# Altium footprint library AltiumDesignerLibraries.PcbLib: 313 footprints (part 13 of 20)
Each footprint in its own frame and in the unit in brackets; x right, y up, seen from the top. Pads: shape width x height; smd on the part's side, far side on the other; paste and mask are expansions set on the pad; w line width, h text height; cw(c..) or ccw(c..) is an arc to the next point about the centre after c.
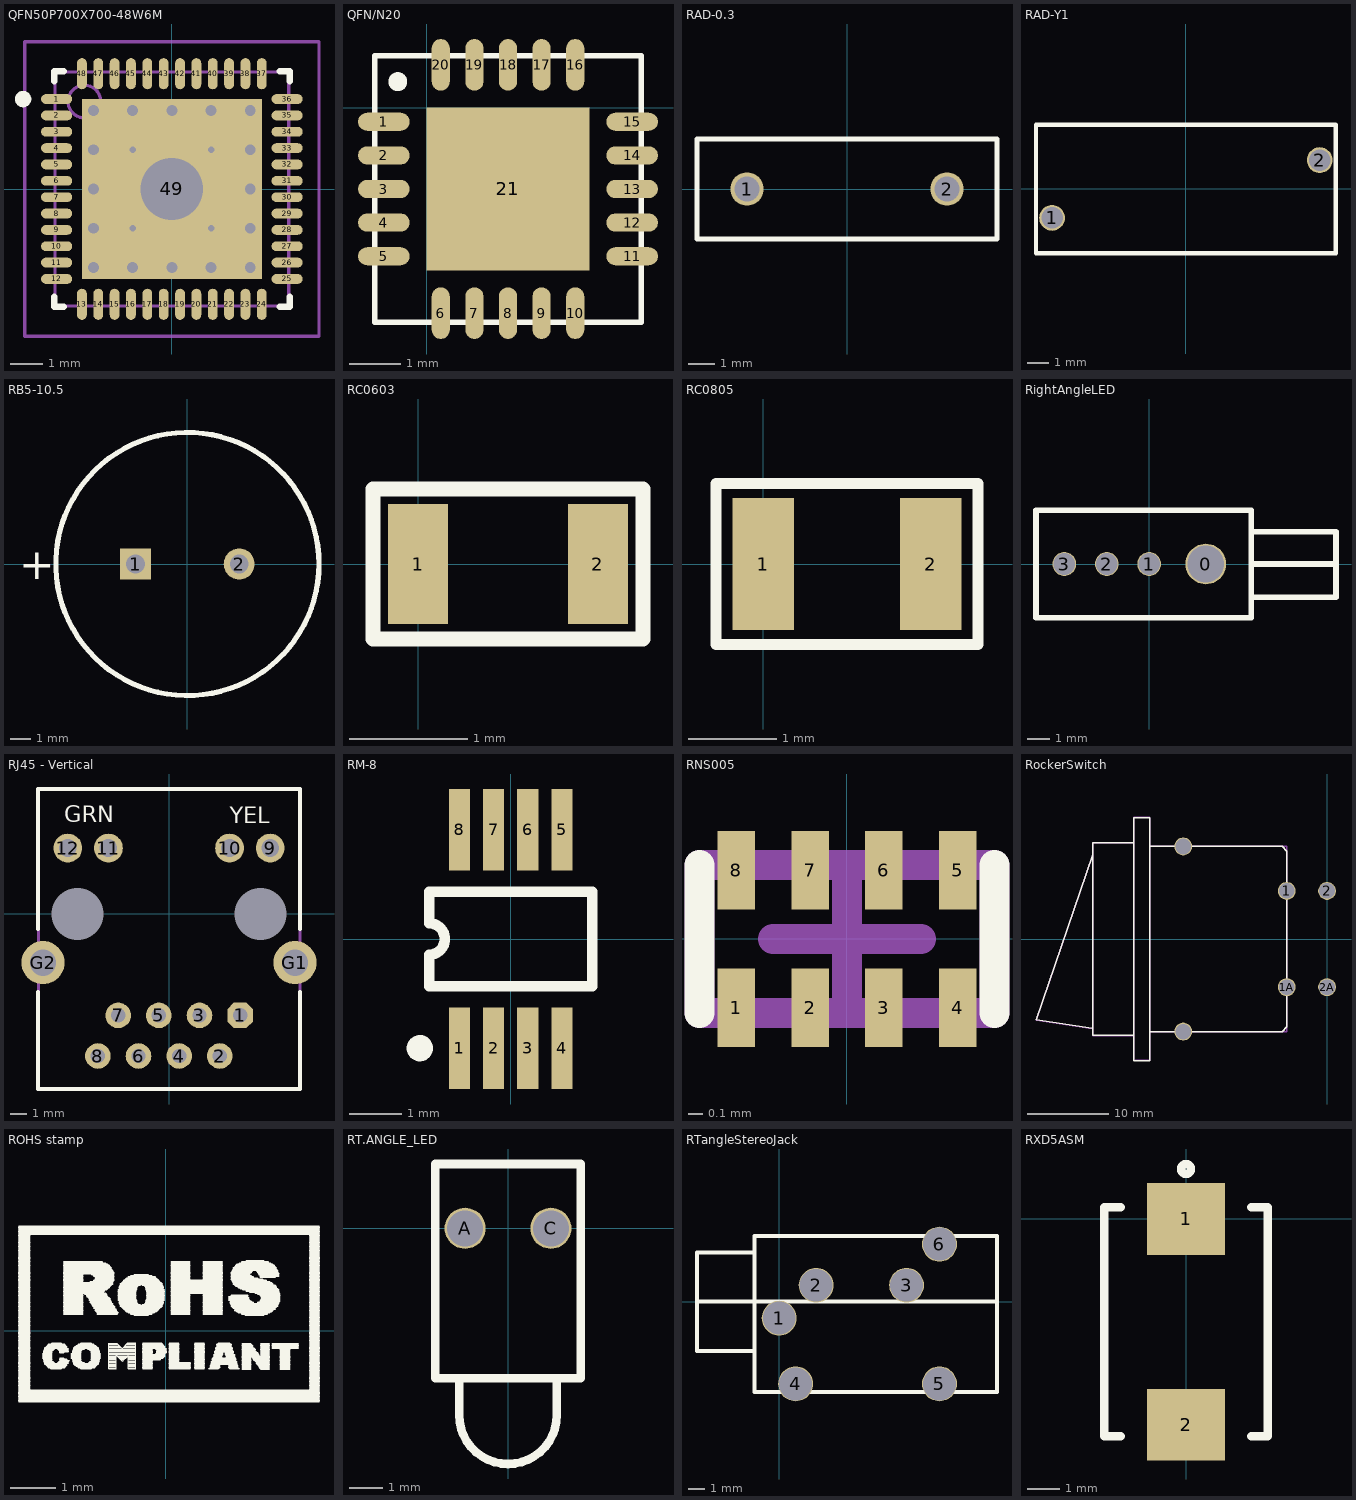
[diagram p12: the footprints below, top view; thin cyan lines are the x and y axes]

## QFN50P700X700-48W6M [mm] "QFN, 48-Leads, Body 7x7mm, Pitch 0.5mm, IPC Low Density"
height 0.8
pads (49):
  oval 0.95x0.3 smd: 1(-3.525,2.75) 2(-3.525,2.25) 3(-3.525,1.75) 4(-3.525,1.25) 5(-3.525,0.75) 6(-3.525,0.25) 7(-3.525,-0.25) 8(-3.525,-0.75) 9(-3.525,-1.25) 10(-3.525,-1.75) 11(-3.525,-2.25) 12(-3.525,-2.75) 25(3.525,-2.75) 26(3.525,-2.25) 27(3.525,-1.75) 28(3.525,-1.25) 29(3.525,-0.75) 30(3.525,-0.25) 31(3.525,0.25) 32(3.525,0.75) 33(3.525,1.25) 34(3.525,1.75) 35(3.525,2.25) 36(3.525,2.75)
  oval 0.3x0.95 smd: 13(-2.75,-3.525) 14(-2.25,-3.525) 15(-1.75,-3.525) 16(-1.25,-3.525) 17(-0.75,-3.525) 18(-0.25,-3.525) 19(0.25,-3.525) 20(0.75,-3.525) 21(1.25,-3.525) 22(1.75,-3.525) 23(2.25,-3.525) 24(2.75,-3.525) 37(2.75,3.525) 38(2.25,3.525) 39(1.75,3.525) 40(1.25,3.525) 41(0.75,3.525) 42(0.25,3.525) 43(-0.25,3.525) 44(-0.75,3.525) 45(-1.25,3.525) 46(-1.75,3.525) 47(-2.25,3.525) 48(-2.75,3.525)
  rect 5.5x5.5 smd: 49(0,0)
via 2.4,-2.4 diameter 0.66 hole 0.33
via 1.2,-2.4 diameter 0.66 hole 0.33
via 0,-2.4 diameter 0.66 hole 0.33
via -1.2,-2.4 diameter 0.66 hole 0.33
via -2.4,-2.4 diameter 0.66 hole 0.33
via 2.4,-1.2 diameter 0.66 hole 0.33
via 1.2,-1.2 diameter 0.66 hole 0.203
via -1.2,-1.2 diameter 0.66 hole 0.203
via -2.4,-1.2 diameter 0.66 hole 0.33
via 2.4,0 diameter 0.66 hole 0.33
via 0,0 diameter 2.54 hole 1.905
via -2.4,0 diameter 0.66 hole 0.33
via 2.4,1.2 diameter 0.66 hole 0.33
via 1.2,1.2 diameter 0.66 hole 0.203
via -1.2,1.2 diameter 0.66 hole 0.203
via -2.4,1.2 diameter 0.66 hole 0.33
via 2.4,2.4 diameter 0.66 hole 0.33
via 1.2,2.4 diameter 0.66 hole 0.33
via 0,2.4 diameter 0.66 hole 0.33
via -1.2,2.4 diameter 0.66 hole 0.33
via -2.4,2.4 diameter 0.66 hole 0.33
Top Overlay:
  circle w0.25: c-4.55,2.75 r0.125
  lines w0.2: -3.6,-3.3 -3.6,-3.6 -3.3,-3.6 ; -3.6,3.3 -3.6,3.6 -3.3,3.6 ; 3.3,-3.6 3.6,-3.6 3.6,-3.3 ; 3.3,3.6 3.6,3.6 3.6,3.3
Mechanical 13:
  circle w0.1: c-2.675,2.675 r0.5
  lines w0.1: -3.575,-3.575 3.575,-3.575 3.575,3.575 -3.575,3.575 -3.575,-3.575
Mechanical 15:
  lines w0.1: -0.5,0 0.5,0 ; 0,-0.5 0,0.5 ; -4.5,-4.5 4.5,-4.5 4.5,4.5 -4.5,4.5 -4.5,-4.5
3D body: height 0.8, standoff 0, extent -3.575,-3.575 3.575,3.575

## QFN/N20 [mm] "QFN 20 pin"
pads (21):
  oval 1x0.35 smd: 1(-0.825,-0.275) 2(-0.825,-0.925) 3(-0.825,-1.575) 4(-0.825,-2.225) 5(-0.825,-2.875) 11(3.975,-2.875) 12(3.975,-2.225) 13(3.975,-1.575) 14(3.975,-0.925) 15(3.975,-0.275)
  oval 0.35x1 smd: 6(0.275,-3.975) 7(0.925,-3.975) 8(1.575,-3.975) 9(2.225,-3.975) 10(2.875,-3.975) 16(2.875,0.825) 17(2.225,0.825) 18(1.575,0.825) 19(0.925,0.825) 20(0.275,0.825)
  rect 3.15x3.15 smd: 21(1.575,-1.575)
Top Overlay:
  circle w0.254: c-0.556,0.5 r0.056
  lines w0.1: -1,-4.15 4.15,-4.15 4.15,1 -1,1 -1,-4.15

## RAD-0.3 [mil]
pads (2):
  round 50 hole 38: 1(-150,0) 2(150,0)
Top Overlay:
  lines w7.87: -225,-75 -225,75 225,75 225,-75 -225,-75

## RAD-Y1 [mm] "Radial Cap, Thru-Hole; 2 Leads; 12.5mm"
pads (2):
  round 1.2 hole 1: 1(-6.25,-1.35) 2(6.25,1.35)
Top Overlay:
  lines w0.2: -7,-3 -7,3 ; -6.985,2.997 6.985,2.997 ; -6.96,-2.997 7.01,-2.997 ; 7,-3 7,3
3D body: height 9.99, standoff 0.01, extent -4.98,-3.048 4.98,2.952

## RB5-10.5 [mm]
pads (2):
  rect 1.5x1.5 hole 0.9: 1(-2.5,0)
  round 1.5 hole 0.9: 2(2.5,0)
Top Overlay:
  circle w0.25: c0,0 r6.35
  text "+" at -8.124,-0.737 h1.5

## RC0603 [mil]
pads (2):
  rect 20x40 smd: 1(0,0) 2(60,0)
Top Overlay:
  lines w5: -15,-25 75,-25 75,25 -15,25 -15,-25

## RC0805 [mil]
pads (2):
  rect 27.5x59 smd: 1(0,0) 2(75,0)
Top Overlay:
  lines w5: -21,-36 -21,36 96,36 96,-36 -21,-36

## RightAngleLED [mil] "3mm Right Angle Bi-Colored LED"
pads (4):
  round 72 hole 65: 0(100,0)
  round 42 hole 38: 1(0,0) 2(-75,0) 3(-150,0)
Top Overlay:
  lines w10: 180,-59 330,-59 330,0 180,0 ; 180,57 330,57 330,-2 ; 180,0 180,-95 -200,-95 -200,95 180,95 180,0

## RJ45 - Vertical [mm] "TRJ0011GBNL -- CONN RJ45  WITH MAGNETIC AND LEDS"
height 13.45
pads (16):
  round 0 hole 3.25 unplated: 0(-5.715,0) 0(5.715,0)
  oct 1.6x1.6 hole 0.9: 1(4.445,-6.35)
  round 1.6 hole 0.9: 2(3.175,-8.89) 3(1.905,-6.35) 4(0.635,-8.89) 5(-0.635,-6.35) 6(-1.905,-8.89) 7(-3.175,-6.35) 8(-4.445,-8.89)
  round 1.8 hole 1.1: 9(6.325,4.11) 10(3.785,4.11) 11(-3.785,4.11) 12(-6.325,4.11)
  round 2.7 hole 1.65: G1(7.875,-3.05) G2(-7.875,-3.05)
Top Overlay:
  lines w0.254: -8.19,-4.888 -8.19,-10.95 8.19,-10.95 8.19,-4.888 ; -8.19,-0.954 -8.19,7.79 ; -8.19,7.8 8.19,7.8 8.19,-0.954
  text "YEL" at 3.81,5.67 h1.02
  text "GRN" at -6.54,5.71 h1.02
Mechanical 13:
  lines w0.164: -8.16,-10.89 -8.16,7.79 8.18,7.79 8.19,7.78 8.19,-10.91 8.17,-10.93 -8.12,-10.93 -8.16,-10.89
3D body: height 17.02, standoff 0, extent -8.242,-11.012 8.272,7.872

## RM-8 [mm] "Shrink Small Outline, MSOP; 8 Leads; Body Width 3 mm; Pitch 0.65 mm"
height 1.1
pads (8):
  rect 0.4x1.55 smd: 1(-0.975,-2.075) 2(-0.325,-2.075) 3(0.325,-2.075) 4(0.975,-2.075) 5(0.975,2.075) 6(0.325,2.075) 7(-0.325,2.075) 8(-0.975,2.075)
Top Overlay:
  circle w0.25: c-1.725,-2.075 r0.125
  lines w0.2: -1.55,-0.9 -1.55,-0.3 ccw(c-1.55,0) -1.55,0.3 -1.55,0.9 1.55,0.9 1.55,-0.9 -1.55,-0.9

## RNS005 [mil] "Resistor Array Package"
height 10
pads (8):
  rect 10x21 smd mask+3: 1(-29.52,-18.31) 2(-9.84,-18.31) 3(9.85,-18.31) 4(29.53,-18.31) 5(29.53,18.3) 6(9.85,18.3) 7(-9.84,18.3) 8(-29.52,18.3)
Top Overlay:
  lines w8: -39.36,-19.69 -39.36,19.68 ; 39.38,-19.69 39.38,19.68
Mechanical 2:
  lines w8: -39.36,-19.69 39.38,-19.69 39.38,19.68 -39.36,19.68 -39.36,-19.69
Mechanical 12:
  lines w8: -19.68,0 19.69,0 ; 0.01,-19.69 0.01,19.68

## RockerSwitch [mm] "Right Angle PCB mountable rocker switch"
height 13.08
pads (6):
  round 2.2 hole 1.92: 1(-4.95,5.915) 1A(-4.95,-5.915) 2(0,5.915) 2A(0,-5.915) SHLD1(-17.68,-11.38) SHLD2(-17.68,11.38)
Top Overlay:
  lines w0.164: -28.89,-11 -35.78,-9.95 -28.78,10.34 ; -28.78,-11.86 -28.78,11.86 -23.79,11.86 -23.79,-11.86 -28.78,-11.86 ; -23.79,-14.935 -23.79,14.935 -21.79,14.935 -21.79,-14.935 -23.79,-14.935 ; -21.79,-11.38 -21.79,11.38 -5.538,11.38 -4.953,10.795 -4.953,0 -4.953,-10.795 -5.538,-11.38 -21.79,-11.38
Mechanical 13:
  lines w0.164: -35.78,-9.96 -28.78,10.33 -28.78,-10.9 -28.89,-11.01 -35.78,-9.96 ; -28.78,-11.87 -23.79,-11.87 -23.79,11.85 -28.78,11.85 -28.78,-11.87 ; -23.79,-14.93 -21.79,-14.93 -21.79,14.94 -23.79,14.94 -23.79,-14.93 ; -21.797,-11.38 -4.96,-11.38 -4.96,11.38 -21.797,11.38 -21.797,-11.38
3D body: height 13.08, standoff 0, extent -28.779,-11.859 -23.791,11.859
3D body: height 13.08, standoff 0, extent -23.789,-14.934 -21.791,14.934
3D body: height 13.08, standoff 0, extent -23.789,-14.929 -21.791,14.939
3D body: height 13.08, standoff 0, extent -28.779,-11.869 -23.791,11.849
3D body: height 13.08, standoff 0, extent -23.789,-14.934 -21.791,14.934
3D body: height 13.08, standoff 0, extent -28.779,-11.859 -23.791,11.859
3D body: height 13.08, standoff 0, extent -28.779,-11.869 -23.791,11.849
3D body: height 13.08, standoff 0, extent -23.789,-14.929 -21.791,14.939
3D body: height 13.08, standoff 0, extent -23.789,-14.929 -21.791,14.939
3D body: height 13.08, standoff 0, extent -28.779,-11.869 -23.791,11.849
3D body: height 13.08, standoff 0, extent -21.796,-11.379 -21.791,11.379
3D body: height 13.08, standoff 0, extent -21.789,-11.379 -4.961,11.379

## ROHS stamp [mm]
Top Overlay:
  drawing of 926 lines, arcs and shapes, not listed

## RT.ANGLE_LED [mil] "Right Angle LED 200mil height"
pads (2):
  round 48 hole 42: A(-50,0) C(50,0)
Top Overlay:
  lines w10: -57,-175 -57,-218 ccw(c0,-218) 57,-218 57,-175 ; -85,-175 85,-175 85,75 -85,75 -85,-175

## RTangleStereoJack [mil] "3.5mm Stereo Jack Right Angle"
pads (6):
  round 85 hole 80: 1(0,-40) 2(90,40) 3(310,40) 4(40,-200) 5(390,-200) 6(390,140)
Top Overlay:
  lines w10: -60.1,68.9 -60,69 ; -60,-120 -200,-120 -200,0 ; -60,120 -200,120 -200,0 ; 530,0 -200,0 ; -60,-220 530,-220 530,160 -60,160 -60,0 -60,-220

## RXD5ASM [mm]
pads (2):
  rect 2.4x2.2 smd: 1(0,0) 2(0,-6.3)
Top Overlay:
  circle w0.254: c0,1.524 r0.152
  lines w0.254: -2,-6.65 -2.5,-6.65 -2.5,0.35 -2,0.35 ; 2,-6.65 2.5,-6.65 2.5,0.35 2,0.35